# Altium footprint library ConnectorsTDH.PcbLib: 194 footprints (part 9 of 13)
Each footprint in its own frame and in the unit in brackets; x right, y up, seen from the top. Pads: shape width x height; smd on the part's side, far side on the other; paste and mask are expansions set on the pad; w line width, h text height; cw(c..) or ccw(c..) is an arc to the next point about the centre after c.
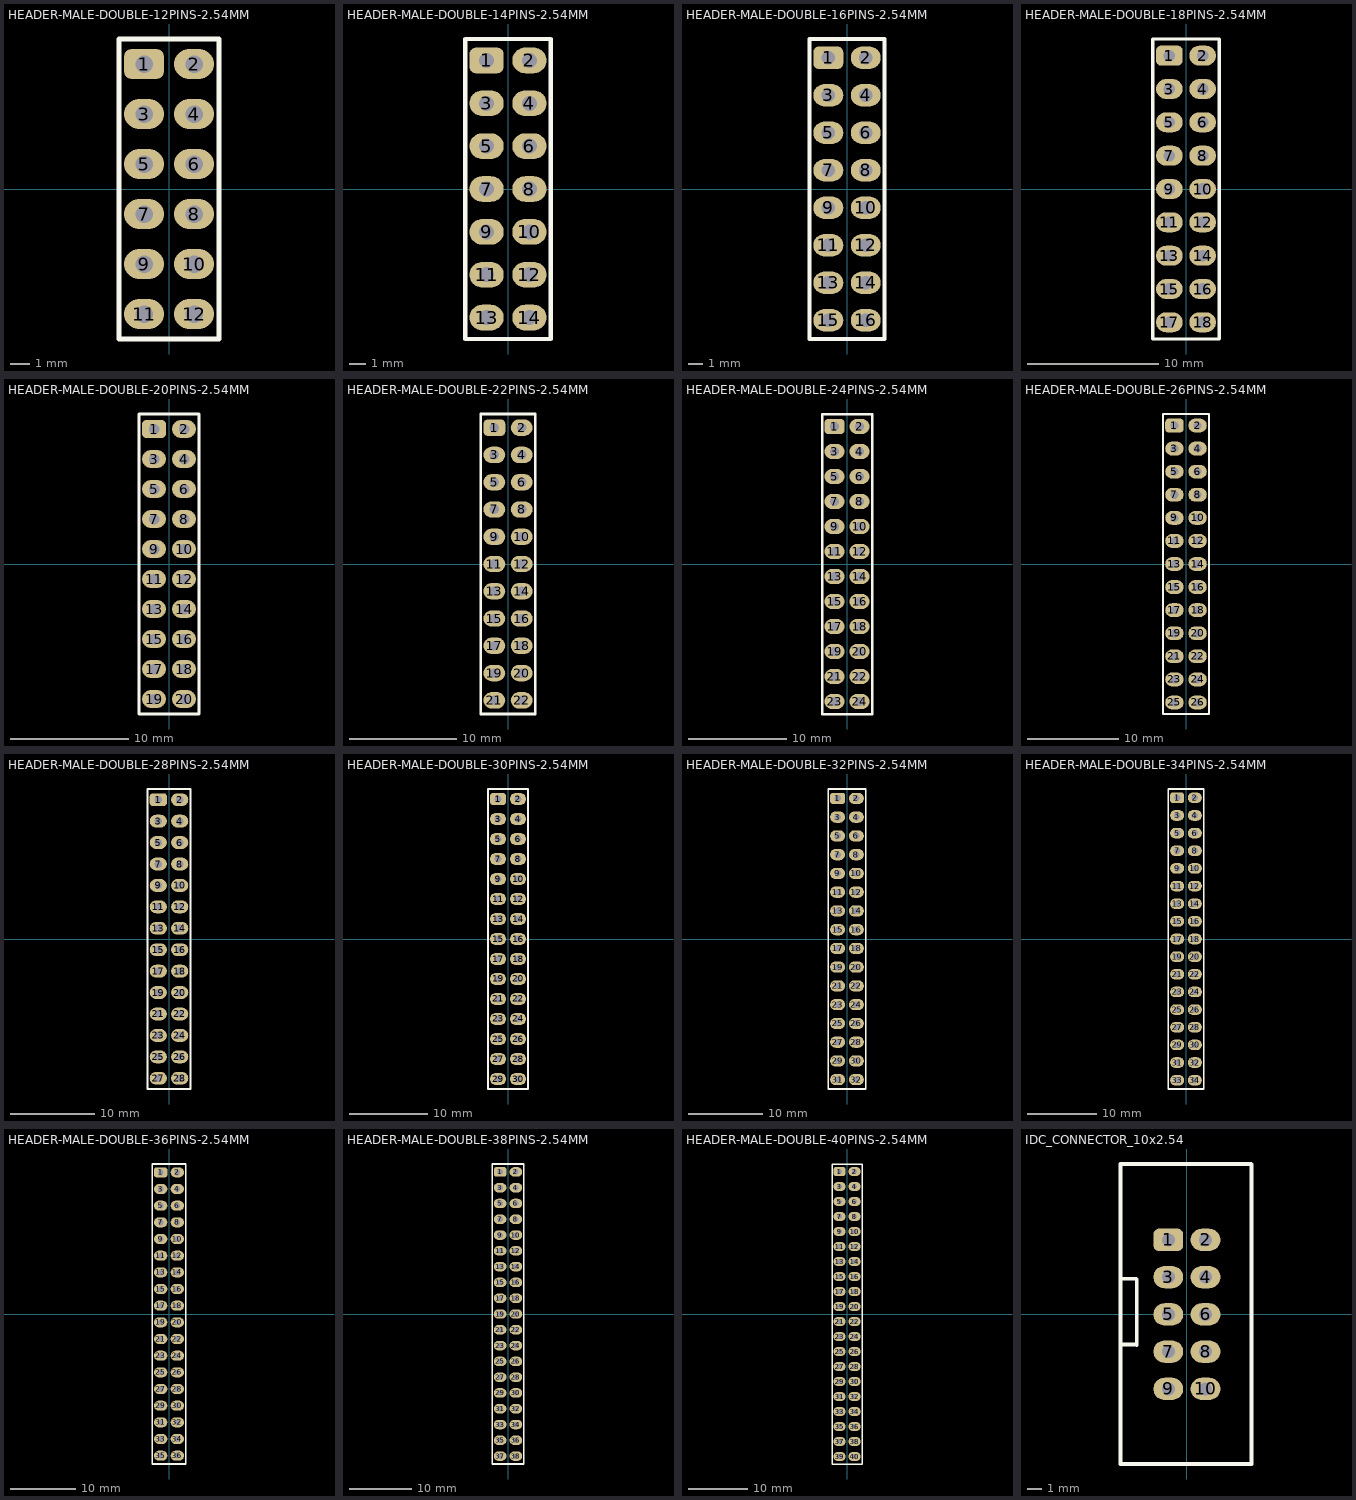
[diagram p8: the footprints below, top view; thin cyan lines are the x and y axes]

## HEADER-MALE-DOUBLE-12PINS-2.54MM [mil]
pads (12):
  rrect50% 80x60 hole 35: 1(-50,250)
  oval 80x60 hole 35: 2(50,250) 3(-50,150) 4(50,150) 5(-50,50) 6(50,50) 7(-50,-50) 8(50,-50) 9(-50,-150) 10(50,-150) 11(-50,-250) 12(50,-250)
Top Overlay:
  lines w10: -100,-300 -100,300 100,300 100,-300 -100,-300
3D body "12-Pin Header - Male - Double - 2.54mm.step": height 350, standoff -120, extent -100,-299.99 100,300.01

## HEADER-MALE-DOUBLE-14PINS-2.54MM [mil]
pads (14):
  rrect50% 80x60 hole 35: 1(-50,300)
  oval 80x60 hole 35: 2(50,300) 3(-50,200) 4(50,200) 5(-50,100) 6(50,100) 7(-50,0) 8(50,0) 9(-50,-100) 10(50,-100) 11(-50,-200) 12(50,-200) 13(-50,-300) 14(50,-300)
Top Overlay:
  lines w10: -100,-350 -100,350 100,350 100,-350 -100,-350
3D body "14-Pin Header - Male - Double - 2.54mm.step": height 350, standoff -120, extent -100,-349.99 100,350.01

## HEADER-MALE-DOUBLE-16PINS-2.54MM [mil]
pads (16):
  rrect50% 80x60 hole 35: 1(-50,350)
  oval 80x60 hole 35: 2(50,350) 3(-50,250) 4(50,250) 5(-50,150) 6(50,150) 7(-50,50) 8(50,50) 9(-50,-50) 10(50,-50) 11(-50,-150) 12(50,-150) 13(-50,-250) 14(50,-250) 15(-50,-350) 16(50,-350)
Top Overlay:
  lines w10: -100,-400 -100,400 100,400 100,-400 -100,-400
3D body "16-Pin Header - Male - Double - 2.54mm.step": height 350, standoff -120, extent -100,-399.99 100,400.01

## HEADER-MALE-DOUBLE-18PINS-2.54MM [mil]
pads (18):
  rrect50% 80x60 hole 35: 1(-50,400)
  oval 80x60 hole 35: 2(50,400) 3(-50,300) 4(50,300) 5(-50,200) 6(50,200) 7(-50,100) 8(50,100) 9(-50,0) 10(50,0) 11(-50,-100) 12(50,-100) 13(-50,-200) 14(50,-200) 15(-50,-300) 16(50,-300) 17(-50,-400) 18(50,-400)
Top Overlay:
  lines w10: -100,-450 -100,450 100,450 100,-450 -100,-450
3D body "18-Pin Header - Male - Double - 2.54mm.step": height 350, standoff -120, extent -100,-449.99 100,450.01

## HEADER-MALE-DOUBLE-20PINS-2.54MM [mil]
pads (20):
  rrect50% 80x60 hole 35: 1(-50,450)
  oval 80x60 hole 35: 2(50,450) 3(-50,350) 4(50,350) 5(-50,250) 6(50,250) 7(-50,150) 8(50,150) 9(-50,50) 10(50,50) 11(-50,-50) 12(50,-50) 13(-50,-150) 14(50,-150) 15(-50,-250) 16(50,-250) 17(-50,-350) 18(50,-350) 19(-50,-450) 20(50,-450)
Top Overlay:
  lines w10: -100,-500 100,-500 100,500 -100,500 -100,-500
3D body "20-Pin Header - Male - Double - 2.54mm.step": height 350, standoff -120, extent -100,-499.99 100,500.01

## HEADER-MALE-DOUBLE-22PINS-2.54MM [mil]
pads (22):
  rrect50% 80x60 hole 35: 1(-50,500)
  oval 80x60 hole 35: 2(50,500) 3(-50,400) 4(50,400) 5(-50,300) 6(50,300) 7(-50,200) 8(50,200) 9(-50,100) 10(50,100) 11(-50,0) 12(50,0) 13(-50,-100) 14(50,-100) 15(-50,-200) 16(50,-200) 17(-50,-300) 18(50,-300) 19(-50,-400) 20(50,-400) 21(-50,-500) 22(50,-500)
Top Overlay:
  lines w10: -100,-550 -100,550 100,550 100,-550 -100,-550
3D body "22-Pin Header - Male - Double - 2.54mm.step": height 350, standoff -120, extent -100,-549.99 100,550.01

## HEADER-MALE-DOUBLE-24PINS-2.54MM [mil]
pads (24):
  rrect50% 80x60 hole 35: 1(-50,550)
  oval 80x60 hole 35: 2(50,550) 3(-50,450) 4(50,450) 5(-50,350) 6(50,350) 7(-50,250) 8(50,250) 9(-50,150) 10(50,150) 11(-50,50) 12(50,50) 13(-50,-50) 14(50,-50) 15(-50,-150) 16(50,-150) 17(-50,-250) 18(50,-250) 19(-50,-350) 20(50,-350) 21(-50,-450) 22(50,-450) 23(-50,-550) 24(50,-550)
Top Overlay:
  lines w10: -100,-600 -100,600 100,600 100,-600 -100,-600
3D body "24-Pin Header - Male - Double - 2.54mm.step": height 350, standoff -120, extent -100,-599.99 100,600.01

## HEADER-MALE-DOUBLE-26PINS-2.54MM [mil]
pads (26):
  rrect50% 80x60 hole 35: 1(-50,600)
  oval 80x60 hole 35: 2(50,600) 3(-50,500) 4(50,500) 5(-50,400) 6(50,400) 7(-50,300) 8(50,300) 9(-50,200) 10(50,200) 11(-50,100) 12(50,100) 13(-50,0) 14(50,0) 15(-50,-100) 16(50,-100) 17(-50,-200) 18(50,-200) 19(-50,-300) 20(50,-300) 21(-50,-400) 22(50,-400) 23(-50,-500) 24(50,-500) 25(-50,-600) 26(50,-600)
Top Overlay:
  lines w10: -100,-650 -100,650 100,650 100,-650 -100,-650
3D body "26-Pin Header - Male - Double - 2.54mm.step": height 350, standoff -120, extent -100,-649.99 100,650.01

## HEADER-MALE-DOUBLE-28PINS-2.54MM [mil]
pads (28):
  rrect50% 80x60 hole 35: 1(-50,650)
  oval 80x60 hole 35: 2(50,650) 3(-50,550) 4(50,550) 5(-50,450) 6(50,450) 7(-50,350) 8(50,350) 9(-50,250) 10(50,250) 11(-50,150) 12(50,150) 13(-50,50) 14(50,50) 15(-50,-50) 16(50,-50) 17(-50,-150) 18(50,-150) 19(-50,-250) 20(50,-250) 21(-50,-350) 22(50,-350) 23(-50,-450) 24(50,-450) 25(-50,-550) 26(50,-550) 27(-50,-650) 28(50,-650)
Top Overlay:
  lines w10: -100,-700 100,-700 100,700 -100,700 -100,-700
3D body "28-Pin Header - Male - Double - 2.54mm.step": height 350, standoff -120, extent -100,-699.99 100,700.01

## HEADER-MALE-DOUBLE-30PINS-2.54MM [mil]
pads (30):
  rrect50% 80x60 hole 35: 1(-50,700)
  oval 80x60 hole 35: 2(50,700) 3(-50,600) 4(50,600) 5(-50,500) 6(50,500) 7(-50,400) 8(50,400) 9(-50,300) 10(50,300) 11(-50,200) 12(50,200) 13(-50,100) 14(50,100) 15(-50,0) 16(50,0) 17(-50,-100) 18(50,-100) 19(-50,-200) 20(50,-200) 21(-50,-300) 22(50,-300) 23(-50,-400) 24(50,-400) 25(-50,-500) 26(50,-500) 27(-50,-600) 28(50,-600) 29(-50,-700) 30(50,-700)
Top Overlay:
  lines w10: -100,-750 -100,750 100,750 100,-750 -100,-750
3D body "30-Pin Header - Male - Double - 2.54mm.step": height 350, standoff -120, extent -100,-749.99 100,750.01

## HEADER-MALE-DOUBLE-32PINS-2.54MM [mil]
pads (32):
  rrect50% 80x60 hole 35: 1(-50,750)
  oval 80x60 hole 35: 2(50,750) 3(-50,650) 4(50,650) 5(-50,550) 6(50,550) 7(-50,450) 8(50,450) 9(-50,350) 10(50,350) 11(-50,250) 12(50,250) 13(-50,150) 14(50,150) 15(-50,50) 16(50,50) 17(-50,-50) 18(50,-50) 19(-50,-150) 20(50,-150) 21(-50,-250) 22(50,-250) 23(-50,-350) 24(50,-350) 25(-50,-450) 26(50,-450) 27(-50,-550) 28(50,-550) 29(-50,-650) 30(50,-650) 31(-50,-750) 32(50,-750)
Top Overlay:
  lines w10: -100,-800 -100,800 100,800 100,-800 -100,-800
3D body "32-Pin Header - Male - Double - 2.54mm.step": height 350, standoff -120, extent -100,-799.99 100,800.01

## HEADER-MALE-DOUBLE-34PINS-2.54MM [mil]
pads (34):
  rrect50% 80x60 hole 35: 1(-50,800)
  oval 80x60 hole 35: 2(50,800) 3(-50,700) 4(50,700) 5(-50,600) 6(50,600) 7(-50,500) 8(50,500) 9(-50,400) 10(50,400) 11(-50,300) 12(50,300) 13(-50,200) 14(50,200) 15(-50,100) 16(50,100) 17(-50,0) 18(50,0) 19(-50,-100) 20(50,-100) 21(-50,-200) 22(50,-200) 23(-50,-300) 24(50,-300) 25(-50,-400) 26(50,-400) 27(-50,-500) 28(50,-500) 29(-50,-600) 30(50,-600) 31(-50,-700) 32(50,-700) 33(-50,-800) 34(50,-800)
Top Overlay:
  lines w10: -100,-850 -100,850 100,850 100,-850 -100,-850
3D body "34-Pin Header - Male - Double - 2.54mm.step": height 350, standoff -120, extent -100,-849.99 100,850.01

## HEADER-MALE-DOUBLE-36PINS-2.54MM [mil]
pads (36):
  rrect50% 80x60 hole 35: 1(-50,850)
  oval 80x60 hole 35: 2(50,850) 3(-50,750) 4(50,750) 5(-50,650) 6(50,650) 7(-50,550) 8(50,550) 9(-50,450) 10(50,450) 11(-50,350) 12(50,350) 13(-50,250) 14(50,250) 15(-50,150) 16(50,150) 17(-50,50) 18(50,50) 19(-50,-50) 20(50,-50) 21(-50,-150) 22(50,-150) 23(-50,-250) 24(50,-250) 25(-50,-350) 26(50,-350) 27(-50,-450) 28(50,-450) 29(-50,-550) 30(50,-550) 31(-50,-650) 32(50,-650) 33(-50,-750) 34(50,-750) 35(-50,-850) 36(50,-850)
Top Overlay:
  lines w10: -100,-900 100,-900 100,900 -100,900 -100,-900
3D body "36-Pin Header - Male - Double - 2.54mm.step": height 350, standoff -120, extent -100,-899.99 100,900.01

## HEADER-MALE-DOUBLE-38PINS-2.54MM [mil]
pads (38):
  rrect50% 80x60 hole 35: 1(-50,900)
  oval 80x60 hole 35: 2(50,900) 3(-50,800) 4(50,800) 5(-50,700) 6(50,700) 7(-50,600) 8(50,600) 9(-50,500) 10(50,500) 11(-50,400) 12(50,400) 13(-50,300) 14(50,300) 15(-50,200) 16(50,200) 17(-50,100) 18(50,100) 19(-50,0) 20(50,0) 21(-50,-100) 22(50,-100) 23(-50,-200) 24(50,-200) 25(-50,-300) 26(50,-300) 27(-50,-400) 28(50,-400) 29(-50,-500) 30(50,-500) 31(-50,-600) 32(50,-600) 33(-50,-700) 34(50,-700) 35(-50,-800) 36(50,-800) 37(-50,-900) 38(50,-900)
Top Overlay:
  lines w10: -100,-950 -100,950 100,950 100,-950 -100,-950
3D body "38-Pin Header - Male - Double - 2.54mm.step": height 350, standoff -120, extent -100,-949.99 100,950.01

## HEADER-MALE-DOUBLE-40PINS-2.54MM [mil]
pads (40):
  rrect50% 80x60 hole 35: 1(-50,950)
  oval 80x60 hole 35: 2(50,950) 3(-50,850) 4(50,850) 5(-50,750) 6(50,750) 7(-50,650) 8(50,650) 9(-50,550) 10(50,550) 11(-50,450) 12(50,450) 13(-50,350) 14(50,350) 15(-50,250) 16(50,250) 17(-50,150) 18(50,150) 19(-50,50) 20(50,50) 21(-50,-50) 22(50,-50) 23(-50,-150) 24(50,-150) 25(-50,-250) 26(50,-250) 27(-50,-350) 28(50,-350) 29(-50,-450) 30(50,-450) 31(-50,-550) 32(50,-550) 33(-50,-650) 34(50,-650) 35(-50,-750) 36(50,-750) 37(-50,-850) 38(50,-850) 39(-50,-950) 40(50,-950)
Top Overlay:
  lines w10: -100,-1000 100,-1000 100,1000 -100,1000 -100,-1000
3D body "40-Pin Header - Male - Double - 2.54mm.step": height 350, standoff -120, extent -100,-999.99 100,1000.01

## IDC_CONNECTOR_10x2.54 [mil]
pads (10):
  rrect50% 80x60 hole 35: 1(-50,200)
  oval 80x60 hole 35: 2(50,200) 3(-50,100) 4(50,100) 5(-50,0) 6(50,0) 7(-50,-100) 8(50,-100) 9(-50,-200) 10(50,-200)
Top Overlay:
  lines w10: -178.15,-81.09 -136.43,-81.09 -134.84,-82.68 -134.84,94.49 -135.88,95.53 -178.15,95.53 ; -178.15,-401.57 172.24,-401.57 173.23,-401.57 173.23,402.07 172.74,402.56 171.75,403.54 -178.15,403.54 -178.15,-400.59 -178.15,-401.57
3D body "DS1013-10S (IDC-10MS CONNFLY).stp": height 122.05, standoff -374.02, extent -177.16,-403.54 173.23,403.54